# Altium footprint library SI944C.PcbLib: 78 footprints (part 1 of 5)
Each footprint in its own frame and in the unit in brackets; x right, y up, seen from the top. Pads: shape width x height; smd on the part's side, far side on the other; paste and mask are expansions set on the pad; w line width, h text height; cw(c..) or ccw(c..) is an arc to the next point about the centre after c.
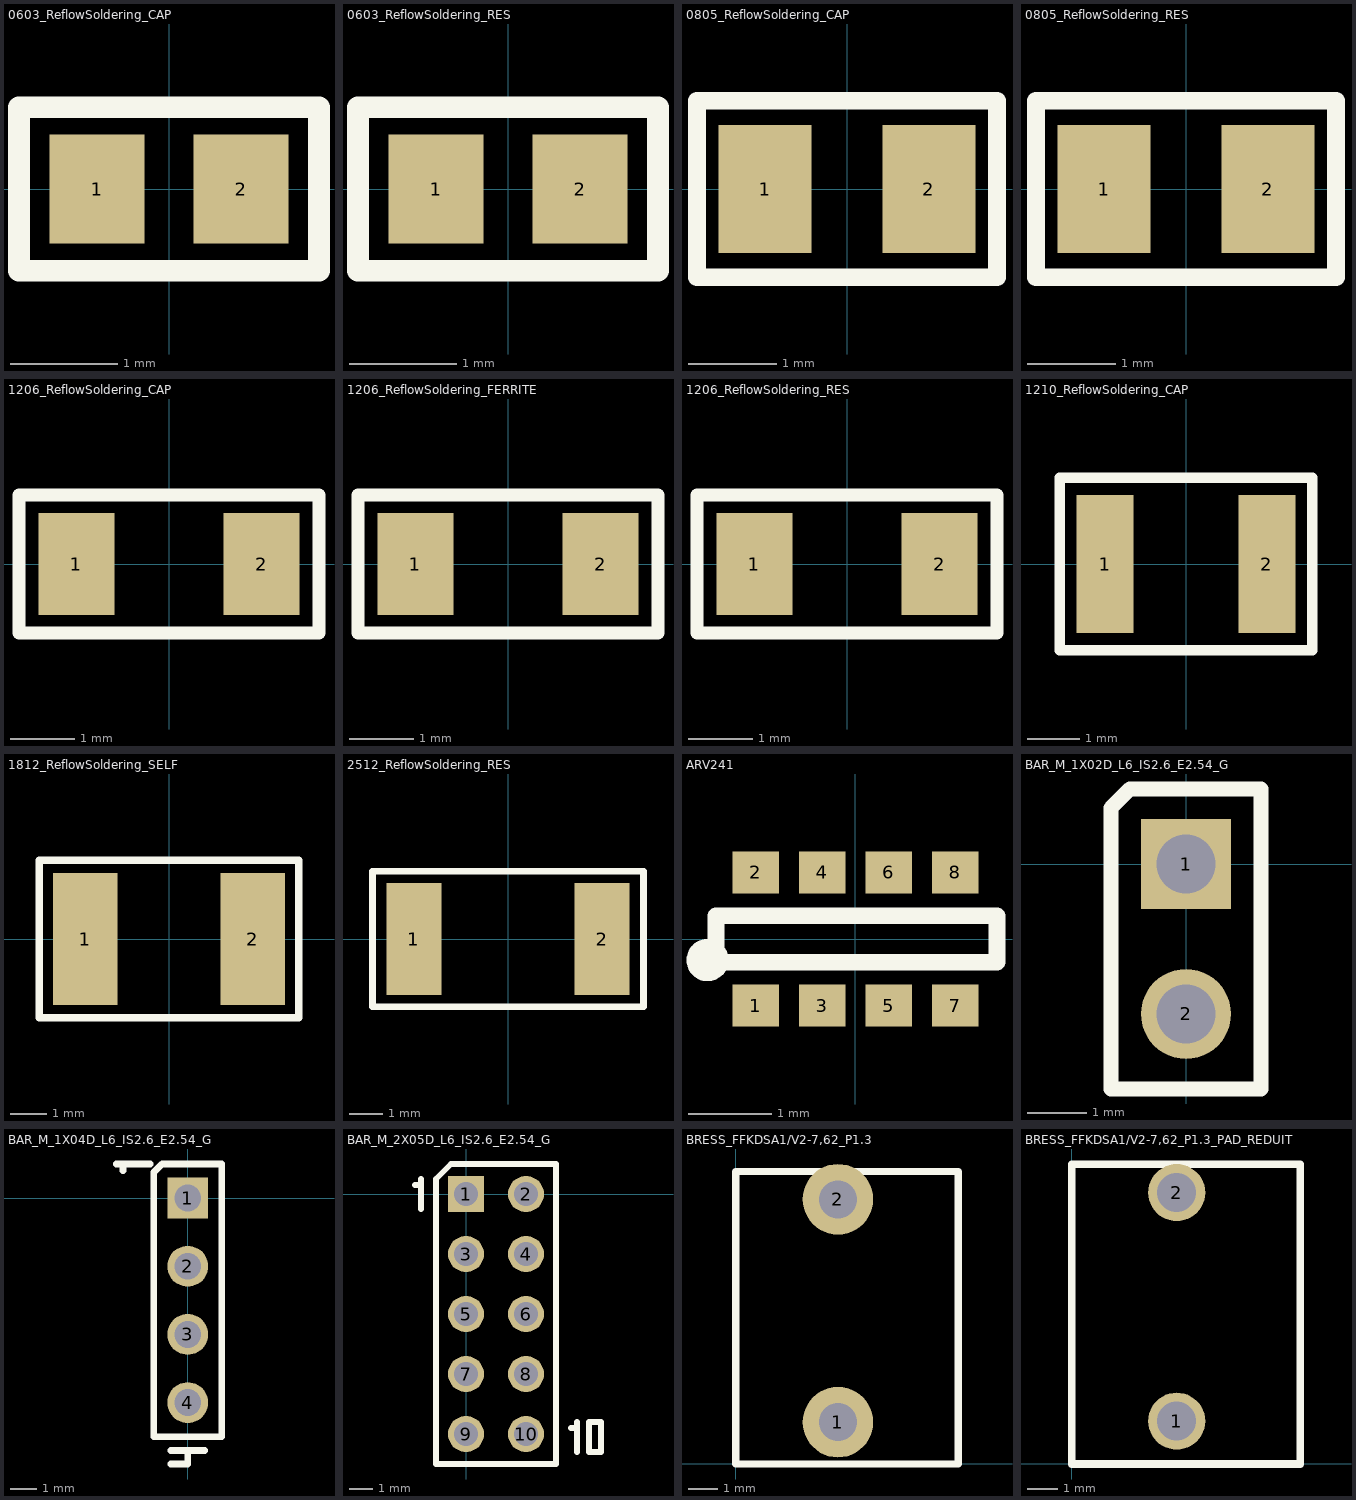
[diagram p0: the footprints below, top view; thin cyan lines are the x and y axes]

## 0603_ReflowSoldering_CAP [mil]
pads (2):
  rect 35x40 smd paste-5: 1(-26.4,0) 2(26.4,0)
Top Overlay:
  lines w8: -55,-30 55,-30 55,30 -55,30 -55,-30
3D body "User Library-CAPC1608X09.STEP": height 35.43, standoff 0, extent -31.49,-15.74 31.5,15.75

## 0603_ReflowSoldering_RES [mil]
height 134.65
pads (2):
  rect 35x40 smd paste-5: 1(-26.4,0) 2(26.4,0)
Top Overlay:
  lines w8: -55,-30 55,-30 55,30 -55,30 -55,-30
3D body "RESC1608X84N.STEP": height 21.65, standoff 0, extent -31.49,-15.75 31.5,15.75

## 0805_ReflowSoldering_CAP [mil]
pads (2):
  rect 41.5x57 smd paste-3: 1(-36.5,0) 2(36.5,0)
Top Overlay:
  lines w8: -66.93,-39.37 66.93,-39.37 66.93,39.37 -66.93,39.37 -66.93,-39.37
3D body "User Library-CAPC2013X10.STEP": height 39.37, standoff 0, extent -39.36,-24.6 39.38,24.61

## 0805_ReflowSoldering_RES [mil]
pads (2):
  rect 41.5x57 smd paste-3: 1(-36.5,0) 2(36.5,0)
Top Overlay:
  lines w8: -66.93,-39.37 66.93,-39.37 66.93,39.37 -66.93,39.37 -66.93,-39.37
3D body "RESC2012X70N.STEP": height 27.56, standoff 0, extent -39.37,-23.62 39.37,23.62

## 1206_ReflowSoldering_CAP [mil]
pads (2):
  rect 47x63 smd paste-3: 1(-57.09,0) 2(57.09,0)
Top Overlay:
  lines w8: -92.5,-42.5 -92.5,42.5 92.5,42.5 92.5,-42.5 -92.5,-42.5
3D body "User Library-CAPC3216X10.STEP": height 39.37, standoff 0, extent -62.99,-31.49 63,31.5

## 1206_ReflowSoldering_FERRITE [mil]
pads (2):
  rect 47x63 smd paste-3: 1(-57.09,0) 2(57.09,0)
Top Overlay:
  lines w8: -92.5,-42.5 92.5,-42.5 92.5,42.5 -92.5,42.5 -92.5,-42.5
3D body "SW3dPS-1206 SMD Resistor.STEP": height 39.45, standoff 0, extent -62.99,-31.5 62.99,31.5

## 1206_ReflowSoldering_RES [mil]
pads (2):
  rect 47x63 smd paste-3: 1(-57.09,0) 2(57.09,0)
Top Overlay:
  lines w8: -92.5,-42.5 92.5,-42.5 92.5,42.5 -92.5,42.5 -92.5,-42.5
3D body "RESC3216X84N.STEP": height 33.07, standoff 0, extent -62.98,-31.49 63,31.5

## 1210_ReflowSoldering_CAP [mil]
pads (2):
  rect 43x104 smd paste-3: 1(-61.02,0) 2(61.02,0)
Top Overlay:
  lines w8: -95,-65 -95,65 95,65 95,-65 -95,-65
3D body "User Library-CAPC3225X13.STEP": height 51.18, standoff 0, extent -62.99,-49.21 63,49.22

## 1812_ReflowSoldering_SELF [mil]
pads (2):
  rect 70x143 smd paste-3: 1(-90.55,0) 2(90.55,0)
Top Overlay:
  lines w8: -140,-85 140,-85 140,85 -140,85 -140,-85
3D body "WE-MPSB_1812_MPSB.stp": height 91.15, standoff 0.6, extent -88.59,-62.99 88.58,63

## 2512_ReflowSoldering_RES [mil]
pads (2):
  rect 65x132 smd paste-3: 1(-111.1,0) 2(111.1,0)
Top Overlay:
  lines w8: -160,-80 -160,80 160,80 160,-80 -160,-80
3D body "RESC6432X76N.STEP": height 27.56, standoff 0, extent -125.98,-62.99 125.99,63

## ARV241 [mil]
pads (8):
  rect 22x20 smd paste-2 mask+5: 1(-47.24,-31.5) 2(-47.24,31.5) 3(-15.75,-31.5) 4(-15.75,31.5) 5(15.75,-31.5) 6(15.75,31.5) 7(47.24,-31.5) 8(47.24,31.5)
Top Overlay:
  circle w10: c-70,-10 r5
  lines w8: -66,-11 67,-11 67,11 -66,11 -66,-11
3D body "User Library-R1206-4R.STEP": height 21.25, standoff -1.39, extent -62.99,-31.5 62.99,31.5

## BAR_M_1X02D_L6_IS2.6_E2.54_G [mil]
pads (2):
  rect 60x60 hole 39.37: 1(0,0)
  round 60 hole 39.37: 2(0,-100)
Top Overlay:
  lines w10: -50,-150 50,-150 50,50 -37.5,50 -50,37.5 -50,-150
3D body: height 0, standoff -78.74, extent -15,-115 15,-85
3D body: height 338.58, standoff 0, extent -15,-115 15,-85
3D body: height 338.58, standoff 0, extent -15,-15 15,15
3D body: height 102.36, standoff 0, extent -55,-155 55,55
3D body: height 0, standoff -78.74, extent -15,-15 15,15

## BAR_M_1X04D_L6_IS2.6_E2.54_G [mil]
pads (4):
  rect 60x60 hole 39.37: 1(0,0)
  round 60 hole 39.37: 2(0,-100) 3(0,-200) 4(0,-300)
Top Overlay:
  lines w10: -105,50 -55,50 ; -95,40 -95,50 ; -25,-390 0,-390 0,-370 ; -25,-370 25,-370 ; -50,-350 -50,37.5 -37.5,50 50,50 50,-350 -50,-350
3D body: height 102.36, standoff 0, extent -50.02,-350.02 50.02,50.02
3D body: height 0, standoff -78.74, extent -15,-315 15,-285
3D body: height 338.58, standoff 0, extent -15,-315 15,-285
3D body: height 0, standoff -78.74, extent -15,-215 15,-185
3D body: height 338.58, standoff 0, extent -15,-215 15,-185
3D body: height 0, standoff -78.74, extent -15,-115 15,-85
3D body: height 338.58, standoff 0, extent -15,-115 15,-85
3D body: height 0, standoff -78.74, extent -15,-15 15,15
3D body: height 338.58, standoff 0, extent -15,-15 15,15

## BAR_M_2X05D_L6_IS2.6_E2.54_G [mil]
pads (10):
  rect 60x60 hole 39.37: 1(0,0)
  round 60 hole 39.37: 2(100,0) 3(0,-100) 4(100,-100) 5(0,-200) 6(100,-200) 7(0,-300) 8(100,-300) 9(0,-400) 10(100,-400)
Top Overlay:
  lines w10: -85,15 -75,15 ; -75,-25 -75,25 ; 175,-390 185,-390 ; 185,-430 185,-380 ; -50,-450 -50,25 -25,50 150,50 150,-450 -50,-450 ; 205,-430 225,-430 225,-380 205,-380 205,-430
3D body: height 338.58, standoff 0, extent -15,-15 15,15
3D body: height 0, standoff -78.74, extent -15,-15 15,15
3D body: height 338.58, standoff 0, extent 85,-15 115,15
3D body: height 0, standoff -78.74, extent 85,-15 115,15
3D body: height 338.58, standoff 0, extent 85,-115 115,-85
3D body: height 0, standoff -78.74, extent 85,-115 115,-85
3D body: height 338.58, standoff 0, extent -15,-115 15,-85
3D body: height 0, standoff -78.74, extent -15,-115 15,-85
3D body: height 338.58, standoff 0, extent -15,-215 15,-185
3D body: height 0, standoff -78.74, extent -15,-215 15,-185
3D body: height 338.58, standoff 0, extent 85,-215 115,-185
3D body: height 0, standoff -78.74, extent 85,-215 115,-185
3D body: height 338.58, standoff 0, extent 85,-315 115,-285
3D body: height 0, standoff -78.74, extent 85,-315 115,-285
3D body: height 338.58, standoff 0, extent -15,-315 15,-285
3D body: height 0, standoff -78.74, extent -15,-315 15,-285
3D body: height 338.58, standoff 0, extent -15,-415 15,-385
3D body: height 0, standoff -78.74, extent -15,-415 15,-385
3D body: height 338.58, standoff 0, extent 85,-415 115,-385
3D body: height 0, standoff -78.74, extent 85,-415 115,-385
3D body: height 102.36, standoff 0, extent -50.02,-450.02 150.02,50.02

## BRESS_FFKDSA1/V2-7,62_P1.3 [mm]
pads (2):
  round 2.413 hole 1.3: 1(3.5,1.43) 2(3.5,9.05)
Top Overlay:
  lines w0.254: 0,0 7.62,0 7.62,10 0,10 0,0
3D body "1790487.stp": height 15.82, standoff -3.38, extent 0,0 7.62,10

## BRESS_FFKDSA1/V2-7,62_P1.3_PAD_REDUIT [mm] "taille de pad reduit"
pads (2):
  round 1.905 hole 1.3: 1(3.5,1.43) 2(3.5,9.05)
Top Overlay:
  lines w0.254: 0,0 7.62,0 7.62,10 0,10 0,0
3D body "1790487.stp": height 15.82, standoff -3.38, extent 0,0 7.62,10